# Altium footprint library Connektor.PcbLib: 305 footprints (part 14 of 20)
Each footprint in its own frame and in the unit in brackets; x right, y up, seen from the top. Pads: shape width x height; smd on the part's side, far side on the other; paste and mask are expansions set on the pad; w line width, h text height; cw(c..) or ccw(c..) is an arc to the next point about the centre after c.
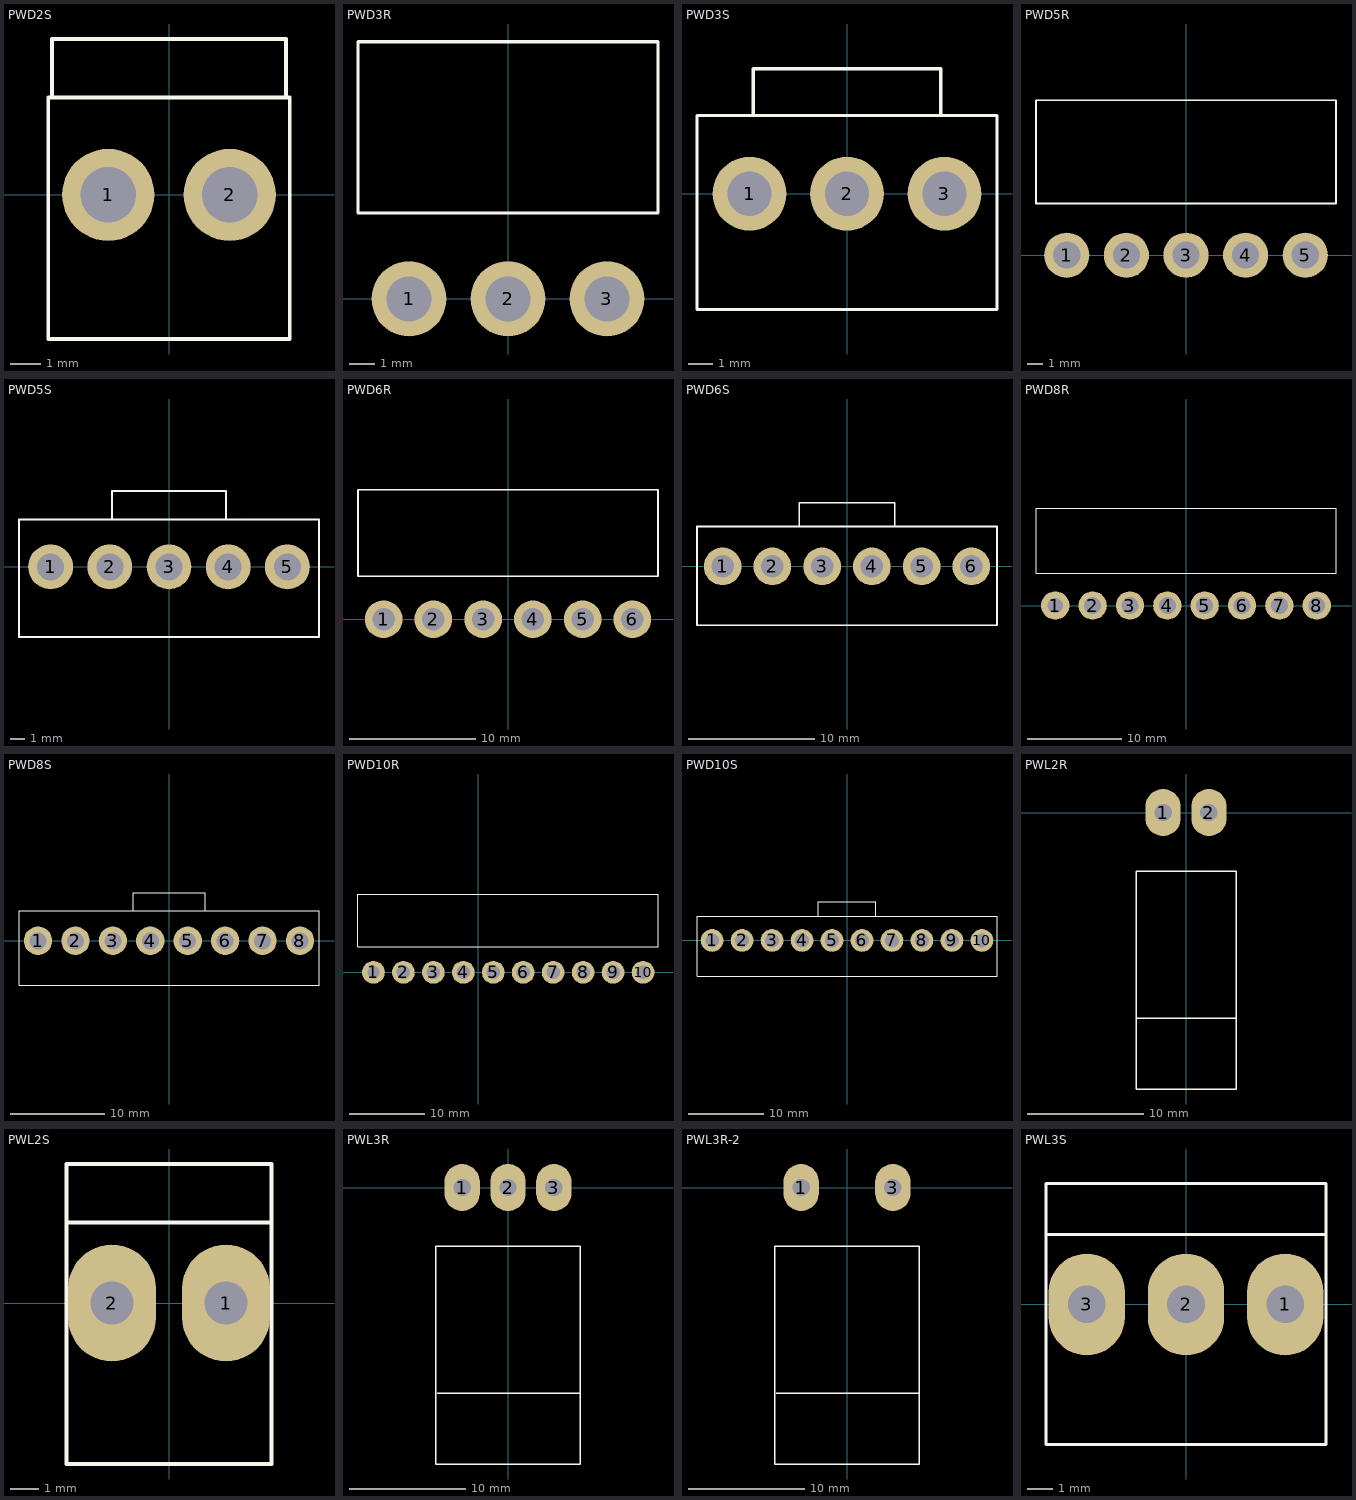
[diagram p13: the footprints below, top view; thin cyan lines are the x and y axes]

## PWD2S [mm]
pads (2):
  round 3 hole 1.8: 1(-1.98,0) 2(1.98,0)
TopOverlay:
  lines w0.127: -3.81,3.175 -3.81,5.08 3.81,5.08 3.81,3.175 ; -3.937,-4.699 3.937,-4.699 3.937,3.175 -3.937,3.175 -3.937,-4.699

## PWD3R [mm]
pads (3):
  round 3 hole 1.8: 1(-3.96,0) 2(0,0) 3(3.96,0)
TopOverlay:
  lines w0.127: -6,3.429 6,3.429 6,10.287 -6,10.287 -6,3.429

## PWD3S [mm]
pads (3):
  round 3 hole 1.8: 1(-3.96,0) 2(0,0) 3(3.96,0)
TopOverlay:
  lines w0.127: -3.81,3.175 -3.81,5.08 3.81,5.08 3.81,3.175 ; -6.096,-4.699 6.096,-4.699 6.096,3.175 -6.096,3.175 -6.096,-4.699

## PWD5R [mm]
pads (5):
  round 3 hole 1.8: 1(-7.92,0) 2(-3.96,0) 3(0,0) 4(3.96,0) 5(7.92,0)
TopOverlay:
  lines w0.127: -9.958,3.429 -9.958,10.287 9.958,10.287 9.958,3.429 -9.958,3.429

## PWD5S [mm]
pads (5):
  round 3 hole 1.8: 1(-7.92,0) 2(-3.96,0) 3(0,0) 4(3.96,0) 5(7.92,0)
TopOverlay:
  lines w0.127: -3.81,3.175 -3.81,5.08 3.81,5.08 3.81,3.175 ; -10.033,-4.699 10.033,-4.699 10.033,3.175 -10.033,3.175 -10.033,-4.699

## PWD6R [mm]
pads (6):
  round 3 hole 1.8: 1(-9.9,0) 2(-5.94,0) 3(-1.98,0) 4(1.98,0) 5(5.94,0) 6(9.9,0)
TopOverlay:
  lines w0.127: -11.938,3.429 -11.938,10.287 11.938,10.287 11.938,3.429 -11.938,3.429

## PWD6S [mm]
pads (6):
  round 3 hole 1.8: 1(-9.9,0) 2(-5.94,0) 3(-1.98,0) 4(1.98,0) 5(5.94,0) 6(9.9,0)
TopOverlay:
  lines w0.127: -3.81,3.175 -3.81,5.08 3.81,5.08 3.81,3.175 ; -11.938,-4.699 -11.938,3.175 11.938,3.175 11.938,-4.699 -11.938,-4.699

## PWD8R [mm]
pads (8):
  round 3 hole 1.6: 1(-13.86,0)
  round 3 hole 1.8: 2(-9.9,0) 3(-5.94,0) 4(-1.98,0) 5(1.98,0) 6(5.94,0) 7(9.9,0) 8(13.86,0)
TopOverlay:
  lines w0.127: -15.9,3.4 15.9,3.4 15.9,10.3 -15.9,10.3 -15.9,3.4

## PWD8S [mm]
pads (8):
  round 3 hole 1.8: 1(-13.86,0) 2(-9.9,0) 3(-5.94,0) 4(-1.98,0) 5(1.98,0) 6(5.94,0) 7(9.9,0) 8(13.86,0)
TopOverlay:
  lines w0.127: -3.81,3.175 -3.81,5.08 3.81,5.08 3.81,3.175 ; -15.875,-4.699 -15.875,3.175 15.875,3.175 15.875,-4.699 -15.875,-4.699

## PWD10R [mm]
pads (10):
  round 3 hole 1.6: 1(-13.86,0)
  round 3 hole 1.8: 2(-9.9,0) 3(-5.94,0) 4(-1.98,0) 5(1.98,0) 6(5.94,0) 7(9.9,0) 8(13.86,0) 9(17.82,0) 10(21.78,0)
TopOverlay:
  lines w0.127: -15.9,3.4 -15.9,10.3 23.76,10.3 23.76,3.4 -15.9,3.4

## PWD10S [mm]
pads (10):
  round 3 hole 1.8: 1(-17.82,0) 2(-13.86,0) 3(-9.9,0) 4(-5.94,0) 5(-1.98,0) 6(1.98,0) 7(5.94,0) 8(9.9,0) 9(13.86,0) 10(17.82,0)
TopOverlay:
  lines w0.127: -3.81,3.175 -3.81,5.08 3.81,5.08 3.81,3.175 ; -19.812,-4.699 19.812,-4.699 19.812,3.175 -19.812,3.175 -19.812,-4.699

## PWL2R [mm]
pads (2):
  oval 3.048x4.064 hole 1.5: 1(-1.98,0) 2(1.98,0)
TopOverlay:
  lines w0.127: -4.318,-17.78 4.318,-17.78 ; -4.318,-23.876 -4.318,-5.08 4.318,-5.08 4.318,-23.876 -4.318,-23.876

## PWL2S [mm]
pads (2):
  oval 3.048x4.064 hole 1.5: 1(1.98,0) 2(-1.98,0)
TopOverlay:
  lines w0.127: -3.556,2.794 3.556,2.794 ; -3.556,-5.588 3.556,-5.588 3.556,4.826 -3.556,4.826 -3.556,-5.588
3D body: height 15, standoff -4.5, extent -3.63,-5.575 3.63,4.775

## PWL3R [mil]
pads (3):
  oval 120x160 hole 59.06: 1(-155.91,0) 2(0,0) 3(155.91,0)
TopOverlay:
  lines w5: -240,-700 245,-700 ; -245,-940 245,-940 245,-200 -245,-200 -245,-940

## PWL3R-2 [mm]
pads (2):
  oval 3.048x4.064 hole 1.5: 1(-3.96,0) 3(3.96,0)
TopOverlay:
  lines w0.127: -6.096,-17.78 6.223,-17.78 ; -6.223,-23.876 6.223,-23.876 6.223,-5.08 -6.223,-5.08 -6.223,-23.876

## PWL3S [mil]
pads (3):
  oval 120x160 hole 59.06: 1(155.91,0) 2(0,0) 3(-155.91,0)
TopOverlay:
  lines w5: -220,110 220,110 ; -220,-220 -220,190 220,190 220,-220 -220,-220
3D body: height 590.55, standoff -177.17, extent -220.86,-219.48 220.87,188